# Altium footprint library common.PcbLib: 552 footprints (part 5 of 35) (continued)
## BGA100P26X26-676 [mm] (continued)
  round 0.762 smd paste-0.762 mask+0.711: FID1(-15,15) FID1(15,-15)
  round 1 on Mech7 paste-0.55 mask+1: FID1(-15,15) FID1(15,-15)
Top Layer:
  circle w0.2: c15,-15 r1
  circle w0.2: c-15,15 r1
Top Overlay:
  circle w0.5: c-14.65,12.7 r0.125
  lines w0.254: -13.5,-12.5 -13.5,13.5 12.5,13.5 13.5,12.5 13.5,-12.5 12.5,-13.5 -12.5,-13.5 -13.5,-12.5
Mechanical 7:
  circle w0.25: c-14.65,12.7 r0.125
  circle w0.254: c-15,15 r1
  circle w0.2: c15,-15 r1
  lines w0.1: -13.5,-12.5 -13.5,13.5 12.5,13.5 13.5,12.5 13.5,-12.5 12.5,-13.5 -12.5,-13.5 -13.5,-12.5
  text ".Designator" at -12.9,12.2 h1.2
  text ".Comment" at -12.9,11.2 h1.2
Mechanical 8:
  circle w0.25: c-14.65,12.7 r0.125
  lines w0.025: -13.5,-12 -13.5,-12.5 -12.5,-13.5 -11,-13.5 ; -13.5,-11 -13.5,-10 ; -13.5,-9 -13.5,-8 ; -13.5,-7 -13.5,-6 ; -13.5,-5 -13.5,-4 ; -13.5,-3 -13.5,-2 ; -13.5,-1 -13.5,0 ; -13.5,1 -13.5,2 ; -13.5,3 -13.5,4 ; -13.5,5 -13.5,6 ; -13.5,7 -13.5,8 ; -13.5,9 -13.5,10 ; -13.5,11 -13.5,12 ; -13.5,13 -13.5,13.5 -12,13.5 ; -11,13.5 -10,13.5 ; -10,-13.5 -9,-13.5 ; -9,13.5 -8,13.5 ; -8,-13.5 -7,-13.5 ; -7,13.5 -6,13.5 ; -6,-13.5 -5,-13.5 ; -5,13.5 -4,13.5 ; -4,-13.5 -3,-13.5 ; -3,13.5 -2,13.5 ; -2,-13.5 -1,-13.5 ; -1,13.5 0,13.5 ; 0,-13.5 1,-13.5 ; 1,13.5 2,13.5 ; 2,-13.5 3,-13.5 ; 3,13.5 4,13.5 ; 4,-13.5 5,-13.5 ; 5,13.5 6,13.5 ; 6,-13.5 7,-13.5 ; 7,13.5 8,13.5 ; 8,-13.5 9,-13.5 ; 9,13.5 10,13.5 ; 10,-13.5 11,-13.5 ; 11,13.5 12.5,13.5 13.5,12.5 13.5,12 ; 12,-13.5 12.5,-13.5 13.5,-12.5 13.5,-11 ; 13.5,-10 13.5,-9 ; 13.5,-8 13.5,-7 ; 13.5,-6 13.5,-5 ; 13.5,-4 13.5,-3 ; 13.5,-2 13.5,-1 ; 13.5,0 13.5,1 ; 13.5,2 13.5,3 ; 13.5,4 13.5,5 ; 13.5,6 13.5,7 ; 13.5,8 13.5,9 ; 13.5,10 13.5,11
3D body: height 1.35, standoff 1, extent -13.464,10.015 -9.86,13.502
3D body: height 2.59, standoff 0.41, extent -13.528,-13.503 13.474,13.498

## BGA169 [mm]
pads (169):
  round 0.25 smd: A4(-1.5,1.5) A6(-1.5,2.5) A9(-1.5,4) A11(-1.5,5) AA1(8.5,0) AA2(8.5,0.5) AA3(8.5,1) AA4(8.5,1.5) AA5(8.5,2) AA6(8.5,2.5) AA7(8.5,3) AA8(8.5,3.5) AA9(8.5,4) AA10(8.5,4.5) AA11(8.5,5) AA12(8.5,5.5) AA13(8.5,6) AA14(8.5,6.5) AE1(10.5,0) AE14(10.5,6.5) AG2(11.5,0.5) AG13(11.5,6) AH4(12,1.5) AH6(12,2.5) AH9(12,4) AH11(12,5) B2(-1,0.5) B13(-1,6) D1(0,0) D14(0,6.5) H1(2,0) H2(2,0.5) H3(2,1) H4(2,1.5) H5(2,2) H6(2,2.5) H7(2,3) H8(2,3.5) H9(2,4) H10(2,4.5) H11(2,5) H12(2,5.5) H13(2,6) H14(2,6.5) J1(2.5,0) J2(2.5,0.5) J3(2.5,1) J4(2.5,1.5) J5(2.5,2) J6(2.5,2.5) J7(2.5,3) J8(2.5,3.5) J9(2.5,4) J10(2.5,4.5) J11(2.5,5) J12(2.5,5.5) J13(2.5,6) J14(2.5,6.5) K1(3,0) K2(3,0.5) K3(3,1) K4(3,1.5) K5(3,2) K6(3,2.5) K7(3,3) K8(3,3.5) K9(3,4) K10(3,4.5) K11(3,5) K12(3,5.5) K13(3,6) K14(3,6.5) L1(3.5,0) L2(3.5,0.5) L3(3.5,1) L4(3.5,1.5) L12(3.5,5.5) L13(3.5,6) L14(3.5,6.5) M1(4,0) M2(4,0.5) M3(4,1) M5(4,2) M6(4,2.5) M7(4,3) M8(4,3.5) M9(4,4) M10(4,4.5) M12(4,5.5) M13(4,6) M14(4,6.5) N1(4.5,0) N2(4.5,0.5) N3(4.5,1) N5(4.5,2) N10(4.5,4.5) N12(4.5,5.5) N13(4.5,6) N14(4.5,6.5) P1(5,0) P2(5,0.5) P3(5,1) P5(5,2) P10(5,4.5) P12(5,5.5) P13(5,6) P14(5,6.5) R1(5.5,0) R2(5.5,0.5) R3(5.5,1) R5(5.5,2) R10(5.5,4.5) R12(5.5,5.5) R13(5.5,6) R14(5.5,6.5) T1(6,0) T2(6,0.5) T3(6,1) T5(6,2) T10(6,4.5) T12(6,5.5) T13(6,6) T14(6,6.5) U1(6.5,0) U2(6.5,0.5) U3(6.5,1) U5(6.5,2) U6(6.5,2.5) U7(6.5,3) U8(6.5,3.5) U9(6.5,4) U10(6.5,4.5) U12(6.5,5.5) U13(6.5,6) U14(6.5,6.5) V1(7,0) V2(7,0.5) V3(7,1) V12(7,5.5) V13(7,6) V14(7,6.5) W1(7.5,0) W2(7.5,0.5) W3(7.5,1) W4(7.5,1.5) W5(7.5,2) W6(7.5,2.5) W7(7.5,3) W8(7.5,3.5) W9(7.5,4) W10(7.5,4.5) W11(7.5,5) W12(7.5,5.5) W13(7.5,6) W14(7.5,6.5) Y1(8,0) Y2(8,0.5) Y3(8,1) Y4(8,1.5) Y5(8,2) Y6(8,2.5) Y7(8,3) Y8(8,3.5) Y9(8,4) Y10(8,4.5) Y11(8,5) Y12(8,5.5) Y13(8,6) Y14(8,6.5)
Top Overlay:
  circle w0.25: c-2.6,-3.4 r0.125
  region: -2.75,-1.75 -1.75,-2.75 -2.75,-2.75
  lines w0.2: -2.75,-1.75 -1.75,-2.75 ; -2.75,-2.75 13.25,-2.75 13.25,9.25 -2.75,9.25 -2.75,-2.75
Mechanical 13:
  lines w0.1: -2.75,-2.75 13.25,-2.75 13.25,9.25 -2.75,9.25 -2.75,-2.75
Mechanical 15:
  lines w0.05: -3,-3 13.5,-3 13.5,9.5 -3,9.5 -3,-3
  lines w0.1: 4.75,3.25 5.75,3.25 ; 5.25,2.75 5.25,3.75
3D body: height 0.9, standoff 0.22, extent -2.75,-2.75 13.25,9.25

## BGA176-10X10 [mm] "BGA, 201-Leads, Body 10.00x10.00mmx0.60mm, Pitch 0.65mm"
height 0.6
pads (201):
  round 0.2 smd: A1(-4.55,4.55) A2(-3.9,4.55) A3(-3.25,4.55) A4(-2.6,4.55) A5(-1.95,4.55) A6(-1.3,4.55) A7(-0.65,4.55) A8(0,4.55) A9(0.65,4.55) A10(1.3,4.55) A11(1.95,4.55) A12(2.6,4.55) A13(3.25,4.55) A14(3.9,4.55) A15(4.55,4.55) B1(-4.55,3.9) B2(-3.9,3.9) B3(-3.25,3.9) B4(-2.6,3.9) B5(-1.95,3.9) B6(-1.3,3.9) B7(-0.65,3.9) B8(0,3.9) B9(0.65,3.9) B10(1.3,3.9) B11(1.95,3.9) B12(2.6,3.9) B13(3.25,3.9) B14(3.9,3.9) B15(4.55,3.9) C1(-4.55,3.25) C2(-3.9,3.25) C3(-3.25,3.25) C4(-2.6,3.25) C6(-1.3,3.25) C10(1.3,3.25) C11(1.95,3.25) C12(2.6,3.25) C13(3.25,3.25) C14(3.9,3.25) C15(4.55,3.25) D1(-4.55,2.6) D2(-3.9,2.6) D3(-3.25,2.6) D4(-2.6,2.6) D6(-1.3,2.6) D10(1.3,2.6) D11(1.95,2.6) D12(2.6,2.6) D13(3.25,2.6) D14(3.9,2.6) D15(4.55,2.6) E1(-4.55,1.95) E2(-3.9,1.95) E3(-3.25,1.95) E4(-2.6,1.95) E12(2.6,1.95) E13(3.25,1.95) E14(3.9,1.95) E15(4.55,1.95) F1(-4.55,1.3) F4(-2.6,1.3) F13(3.25,1.3) F14(3.9,1.3) F15(4.55,1.3) G1(-4.55,0.65) G4(-2.6,0.65) G14(3.9,0.65) G15(4.55,0.65) H1(-4.55,0) H2(-3.9,0) H3(-3.25,0) H4(-2.6,0) H14(3.9,0) H15(4.55,0) J1(-4.55,-0.65) J2(-3.9,-0.65) J3(-3.25,-0.65) J4(-2.6,-0.65) J14(3.9,-0.65) J15(4.55,-0.65) K1(-4.55,-1.3) K2(-3.9,-1.3) K3(-3.25,-1.3) K12(2.6,-1.3) K13(3.25,-1.3) K14(3.9,-1.3) K15(4.55,-1.3) L1(-4.55,-1.95) L2(-3.9,-1.95) L3(-3.25,-1.95) L4(-2.6,-1.95) L12(2.6,-1.95) L13(3.25,-1.95) L14(3.9,-1.95) L15(4.55,-1.95) M1(-4.55,-2.6) M2(-3.9,-2.6) M3(-3.25,-2.6) M4(-2.6,-2.6) M5(-1.95,-2.6) M6(-1.3,-2.6) M7(-0.65,-2.6) M10(1.3,-2.6) M11(1.95,-2.6) M12(2.6,-2.6) M13(3.25,-2.6) M14(3.9,-2.6) M15(4.55,-2.6) N1(-4.55,-3.25) N2(-3.9,-3.25) N3(-3.25,-3.25) N4(-2.6,-3.25) N5(-1.95,-3.25) N6(-1.3,-3.25) N7(-0.65,-3.25) N11(1.95,-3.25) N12(2.6,-3.25) N13(3.25,-3.25) N14(3.9,-3.25) N15(4.55,-3.25) P1(-4.55,-3.9) P2(-3.9,-3.9) P3(-3.25,-3.9) P4(-2.6,-3.9) P5(-1.95,-3.9) P6(-1.3,-3.9) P7(-0.65,-3.9) P8(0,-3.9) P9(0.65,-3.9) P10(1.3,-3.9) P11(1.95,-3.9) P12(2.6,-3.9) P13(3.25,-3.9) P14(3.9,-3.9) P15(4.55,-3.9) P$_VDD(-3.25,0.65) P$_VDD(-3.25,1.3) P$_VDD(-2.6,-1.3) P$_VDD(-1.95,3.25) P$_VDD(-0.65,3.25) P$_VDD(0,-3.25) P$_VDD(0,3.25) P$_VDD(0.65,-3.25) P$_VDD(0.65,3.25) P$_VDD(1.3,-3.25) P$_VDD(2.6,-0.65) P$_VDD(3.25,-0.65) P$_VDD(3.25,0) P$_VDD(3.25,0.65) P$_VSS(-3.9,0.65) P$_VSS(-3.9,1.3) P$_VSS(-1.95,2.6) P$_VSS(-1.3,-1.3) P$_VSS(-1.3,-0.65) P$_VSS(-1.3,0) P$_VSS(-1.3,0.65) P$_VSS(-1.3,1.3) P$_VSS(-0.65,-1.3) P$_VSS(-0.65,-0.65) P$_VSS(-0.65,0) P$_VSS(-0.65,0.65) P$_VSS(-0.65,1.3) P$_VSS(-0.65,2.6) P$_VSS(0,-2.6) P$_VSS(0,-1.3) P$_VSS(0,-0.65) P$_VSS(0,0) P$_VSS(0,0.65) P$_VSS(0,1.3) P$_VSS(0,2.6) P$_VSS(0.65,-2.6) P$_VSS(0.65,-1.3) P$_VSS(0.65,-0.65) P$_VSS(0.65,0) P$_VSS(0.65,0.65) P$_VSS(0.65,1.3) P$_VSS(0.65,2.6) P$_VSS(1.3,-1.3) P$_VSS(1.3,-0.65) P$_VSS(1.3,0) P$_VSS(1.3,0.65) P$_VSS(1.3,1.3) P$_VSS(2.6,0) P$_VSS(2.6,0.65) P$_VSS(2.6,1.3) R1(-4.55,-4.55) R2(-3.9,-4.55) R3(-3.25,-4.55) R4(-2.6,-4.55) R5(-1.95,-4.55) R6(-1.3,-4.55) R7(-0.65,-4.55) R8(0,-4.55) R9(0.65,-4.55) R10(1.3,-4.55) R11(1.95,-4.55) R12(2.6,-4.55) R13(3.25,-4.55) R14(3.9,-4.55) R15(4.55,-4.55)
Top Overlay:
  circle w0.25: c-5.21,5.21 r0.125
  lines w0.1: -5,-5 5,-5 5,5 -5,5 -5,-5
3D body: height 0, standoff -1, extent -5,-5 5,5

## BGA176-15X15 [mm] "BGA, 176-Leads, Body 15.00x15.00mmx3.50mm, Pitch 1.00mm"
height 3.5
pads (176):
  round 0.5 smd: A1(-6.5,6.5) A2(-5.5,6.5) A3(-4.5,6.5) A4(-3.5,6.5) A5(-2.5,6.5) A6(-1.5,6.5) A7(-0.5,6.5) A8(0.5,6.5) A9(1.5,6.5) A10(2.5,6.5) A11(3.5,6.5) A12(4.5,6.5) A13(5.5,6.5) A14(6.5,6.5) B1(-6.5,5.5) B2(-5.5,5.5) B3(-4.5,5.5) B4(-3.5,5.5) B5(-2.5,5.5) B6(-1.5,5.5) B7(-0.5,5.5) B8(0.5,5.5) B9(1.5,5.5) B10(2.5,5.5) B11(3.5,5.5) B12(4.5,5.5) B13(5.5,5.5) B14(6.5,5.5) C1(-6.5,4.5) C2(-5.5,4.5) C3(-4.5,4.5) C4(-3.5,4.5) C5(-2.5,4.5) C6(-1.5,4.5) C7(-0.5,4.5) C8(0.5,4.5) C9(1.5,4.5) C10(2.5,4.5) C11(3.5,4.5) C12(4.5,4.5) C13(5.5,4.5) C14(6.5,4.5) D1(-6.5,3.5) D2(-5.5,3.5) D3(-4.5,3.5) D4(-3.5,3.5) D5(-2.5,3.5) D6(-1.5,3.5) D7(-0.5,3.5) D8(0.5,3.5) D9(1.5,3.5) D10(2.5,3.5) D11(3.5,3.5) D12(4.5,3.5) D13(5.5,3.5) D14(6.5,3.5) E1(-6.5,2.5) E2(-5.5,2.5) E3(-4.5,2.5) E4(-3.5,2.5) E11(3.5,2.5) E12(4.5,2.5) E13(5.5,2.5) E14(6.5,2.5) F1(-6.5,1.5) F2(-5.5,1.5) F3(-4.5,1.5) F4(-3.5,1.5) F6(-1.5,1.5) F7(-0.5,1.5) F8(0.5,1.5) F9(1.5,1.5) F11(3.5,1.5) F12(4.5,1.5) F13(5.5,1.5) F14(6.5,1.5) G1(-6.5,0.5) G2(-5.5,0.5) G3(-4.5,0.5) G4(-3.5,0.5) G6(-1.5,0.5) G7(-0.5,0.5) G8(0.5,0.5) G9(1.5,0.5) G11(3.5,0.5) G12(4.5,0.5) G13(5.5,0.5) G14(6.5,0.5) H1(-6.5,-0.5) H2(-5.5,-0.5) H3(-4.5,-0.5) H4(-3.5,-0.5) H6(-1.5,-0.5) H7(-0.5,-0.5) H8(0.5,-0.5) H9(1.5,-0.5) H11(3.5,-0.5) H12(4.5,-0.5) H13(5.5,-0.5) H14(6.5,-0.5) J1(-6.5,-1.5) J2(-5.5,-1.5) J3(-4.5,-1.5) J4(-3.5,-1.5) J6(-1.5,-1.5) J7(-0.5,-1.5) J8(0.5,-1.5) J9(1.5,-1.5) J11(3.5,-1.5) J12(4.5,-1.5) J13(5.5,-1.5) J14(6.5,-1.5) K1(-6.5,-2.5) K2(-5.5,-2.5) K3(-4.5,-2.5) K4(-3.5,-2.5) K11(3.5,-2.5) K12(4.5,-2.5) K13(5.5,-2.5) K14(6.5,-2.5) L1(-6.5,-3.5) L2(-5.5,-3.5) L3(-4.5,-3.5) L4(-3.5,-3.5) L5(-2.5,-3.5) L6(-1.5,-3.5) L7(-0.5,-3.5) L8(0.5,-3.5) L9(1.5,-3.5) L10(2.5,-3.5) L11(3.5,-3.5) L12(4.5,-3.5) L13(5.5,-3.5) L14(6.5,-3.5) M1(-6.5,-4.5) M2(-5.5,-4.5) M3(-4.5,-4.5) M4(-3.5,-4.5) M5(-2.5,-4.5) M6(-1.5,-4.5) M7(-0.5,-4.5) M8(0.5,-4.5) M9(1.5,-4.5) M10(2.5,-4.5) M11(3.5,-4.5) M12(4.5,-4.5) M13(5.5,-4.5) M14(6.5,-4.5) N1(-6.5,-5.5) N2(-5.5,-5.5) N3(-4.5,-5.5) N4(-3.5,-5.5) N5(-2.5,-5.5) N6(-1.5,-5.5) N7(-0.5,-5.5) N8(0.5,-5.5) N9(1.5,-5.5) N10(2.5,-5.5) N11(3.5,-5.5) N12(4.5,-5.5) N13(5.5,-5.5) N14(6.5,-5.5) P1(-6.5,-6.5) P2(-5.5,-6.5) P3(-4.5,-6.5) P4(-3.5,-6.5) P5(-2.5,-6.5) P6(-1.5,-6.5) P7(-0.5,-6.5) P8(0.5,-6.5) P9(1.5,-6.5) P10(2.5,-6.5) P11(3.5,-6.5) P12(4.5,-6.5) P13(5.5,-6.5) P14(6.5,-6.5)
Top Overlay:
  circle w0.25: c-8.15,7.35 r0.125
  region: -6.5,7.5 -7.5,6.5 -7.5,7.5
  lines w0.2: -7.5,6.5 -6.5,7.5 ; -7.5,-7.5 -7.5,7.5 7.5,7.5 7.5,-7.5 -7.5,-7.5
Mechanical 13:
  lines w0.1: -7.5,-7.5 -7.5,7.5 7.5,7.5 7.5,-7.5 -7.5,-7.5
3D body: height 3.5, standoff 0.3, extent -7.5,-7.5 7.5,7.5

## BGA256 [mil]
pads (256):
  round 20 smd: A1(0,0) A2(39.37,0) A3(78.74,0) A4(118.11,0) A5(157.48,0) A6(196.85,0) A7(236.22,0) A8(275.59,0) A9(314.96,0) A10(354.33,0) A11(393.7,0) A12(433.07,0) A13(472.44,0) A14(511.81,0) A15(551.18,0) A16(590.55,0) B1(0,-39.37) B2(39.37,-39.37) B3(78.74,-39.37) B4(118.11,-39.37) B5(157.48,-39.37) B6(196.85,-39.37) B7(236.22,-39.37) B8(275.59,-39.37) B9(314.96,-39.37) B10(354.33,-39.37) B11(393.7,-39.37) B12(433.07,-39.37) B13(472.44,-39.37) B14(511.81,-39.37) B15(551.18,-39.37) B16(590.55,-39.37) C1(0,-78.74) C2(39.37,-78.74) C3(78.74,-78.74) C4(118.11,-78.74) C5(157.48,-78.74) C6(196.85,-78.74) C7(236.22,-78.74) C8(275.59,-78.74) C9(314.96,-78.74) C10(354.33,-78.74) C11(393.7,-78.74) C12(433.07,-78.74) C13(472.44,-78.74) C14(511.81,-78.74) C15(551.18,-78.74) C16(590.55,-78.74) D1(0,-118.11) D2(39.37,-118.11) D3(78.74,-118.11) D4(118.11,-118.11) D5(157.48,-118.11) D6(196.85,-118.11) D7(236.22,-118.11) D8(275.59,-118.11) D9(314.96,-118.11) D10(354.33,-118.11) D11(393.7,-118.11) D12(433.07,-118.11) D13(472.44,-118.11) D14(511.81,-118.11) D15(551.18,-118.11) D16(590.55,-118.11) E1(0,-157.48) E2(39.37,-157.48) E3(78.74,-157.48) E4(118.11,-157.48) E5(157.48,-157.48) E6(196.85,-157.48) E7(236.22,-157.48) E8(275.59,-157.48) E9(314.96,-157.48) E10(354.33,-157.48) E11(393.7,-157.48) E12(433.07,-157.48) E13(472.44,-157.48) E14(511.81,-157.48) E15(551.18,-157.48) E16(590.55,-157.48) F1(0,-196.85) F2(39.37,-196.85) F3(78.74,-196.85) F4(118.11,-196.85) F5(157.48,-196.85) F6(196.85,-196.85) F7(236.22,-196.85) F8(275.59,-196.85) F9(314.96,-196.85) F10(354.33,-196.85) F11(393.7,-196.85) F12(433.07,-196.85) F13(472.44,-196.85) F14(511.81,-196.85) F15(551.18,-196.85) F16(590.55,-196.85) G1(0,-236.22) G2(39.37,-236.22) G3(78.74,-236.22) G4(118.11,-236.22) G5(157.48,-236.22) G6(196.85,-236.22) G7(236.22,-236.22) G8(275.59,-236.22) G9(314.96,-236.22) G10(354.33,-236.22) G11(393.7,-236.22) G12(433.07,-236.22) G13(472.44,-236.22) G14(511.81,-236.22) G15(551.18,-236.22) G16(590.55,-236.22) H1(0,-275.59) H2(39.37,-275.59) H3(78.74,-275.59) H4(118.11,-275.59) H5(157.48,-275.59) H6(196.85,-275.59) H7(236.22,-275.59) H8(275.59,-275.59) H9(314.96,-275.59) H10(354.33,-275.59) H11(393.7,-275.59) H12(433.07,-275.59) H13(472.44,-275.59) H14(511.81,-275.59) H15(551.18,-275.59) H16(590.55,-275.59) J1(0,-313.99) J2(39.37,-313.99) J3(78.74,-313.99) J4(118.11,-313.99) J5(157.48,-313.99) J6(196.85,-313.99) J7(236.22,-313.99) J8(275.59,-313.99) J9(314.96,-313.99) J10(354.33,-313.99) J11(393.7,-313.99) J12(433.07,-313.99) J13(472.44,-313.99) J14(511.81,-313.99) J15(551.18,-313.99) J16(590.55,-313.99) K1(0,-354) K2(39.37,-354) K3(78.74,-354) K4(118.11,-354) K5(157.48,-354) K6(196.85,-354) K7(236.22,-354) K8(275.59,-354) K9(314.96,-354) K10(354.33,-354) K11(393.7,-354) K12(433.07,-354) K13(472.44,-354) K14(511.81,-354) K15(551.18,-354) K16(590.55,-354) L1(0,-393.7) L2(39.37,-393.7) L3(78.74,-393.7) L4(118.11,-393.7) L5(157.48,-393.7) L6(196.85,-393.7) L7(236.22,-393.7) L8(275.59,-393.7) L9(314.96,-393.7) L10(354.33,-393.7) L11(393.7,-393.7) L12(433.07,-393.7) L13(472.44,-393.7) L14(511.81,-393.7) L15(551.18,-393.7) L16(590.55,-393.7) M1(0,-433.07) M2(39.37,-433.07) M3(78.74,-433.07) M4(118.11,-433.07) M5(157.48,-433.07) M6(196.85,-433.07) M7(236.22,-433.07) M8(275.59,-433.07) M9(314.96,-433.07) M10(354.33,-433.07) M11(393.7,-433.07) M12(433.07,-433.07) M13(472.44,-433.07) M14(511.81,-433.07) M15(551.18,-433.07) M16(590.55,-433.07) N1(0,-471.97) N2(39.37,-471.97) N3(78.74,-471.97) N4(118.11,-471.97) N5(157.48,-471.97) N6(196.85,-471.97) N7(236.22,-471.97) N8(275.59,-471.97) N9(314.96,-471.97) N10(354.33,-471.97) N11(393.7,-471.97) N12(433.07,-471.97) N13(472.44,-471.97) N14(511.81,-471.97) N15(551.18,-471.97) N16(590.55,-471.97) P1(0,-510.94) P2(39.37,-510.94) P3(78.74,-510.94) P4(118.11,-510.94) P5(157.48,-510.94) P6(196.85,-510.94) P7(236.22,-510.94) P8(275.59,-510.94) P9(314.96,-510.94) P10(354.33,-510.94) P11(393.7,-510.94) P12(433.07,-510.94) P13(472.44,-510.94) P14(511.81,-510.94) P15(551.18,-510.94) P16(590.55,-510.94) R1(0,-550.96) R2(39.37,-550.96) R3(78.74,-550.96) R4(118.11,-550.96) R5(157.48,-550.96) R6(196.85,-550.96) R7(236.22,-550.96) R8(275.59,-550.96) R9(314.96,-550.96) R10(354.33,-550.96) R11(393.7,-550.96) R12(433.07,-550.96) R13(472.44,-550.96) R14(511.81,-550.96) R15(551.18,-550.96) R16(590.55,-550.96) T1(0,-590.55) T2(39.37,-590.55) T3(78.74,-590.55) T4(118.11,-590.55) T5(157.48,-590.55) T6(196.85,-590.55) T7(236.22,-590.55) T8(275.59,-590.55) T9(314.96,-590.55) T10(354.33,-590.55) T11(393.7,-590.55) T12(433.07,-590.55) T13(472.44,-590.55) T14(511.81,-590.55) T15(551.18,-590.55) T16(590.55,-590.55)
Top Overlay:
  lines w8: -42.98,20.07 -15.98,47.07 635.23,47.07 635.23,-630.93 -42.77,-630.93 -42.77,18.09
Mechanical 13:
  text "16" at 585,-658 h20
  text "15" at 544.67,-658 h20
  text "15" at 544.67,-658 h20
  text "14" at 504.33,-658 h20
  text "13" at 464,-658 h20
  text "12" at 423.67,-658 h20
  text "11" at 388,-658 h20
  text "10" at 343,-658 h20
  text "10" at 343,-658 h20
  text "9" at 311,-658 h20
  text "8" at 272,-658 h20
  text "7" at 234,-658 h20
  text "6" at 191,-658 h20
  text "5" at 152,-658 h20
  text "4" at 110,-658 h20
  text "3" at 73,-658 h20
  text "2" at 32,-658 h20
  text "1" at -3,-658 h20
  text "1" at -3,-658 h20
  text "T" at -67,-606 h25
  text "R" at -67,-566.33 h25
  text "P" at -67,-526.67 h25
  text "N" at -67,-487 h25
  text "M" at -67,-447.33 h25
  text "L" at -67,-407.67 h25
  text "K" at -67,-368 h25
  text "J" at -67,-328.33 h25
  text "H" at -67,-288.67 h25
  text "G" at -67,-249 h25
  text "F" at -67,-209.33 h25
  text "E" at -67,-169.67 h25
  text "D" at -67,-130 h25
  text "C" at -67,-90.33 h25
  text "B" at -67,-50.67 h25
  text "A" at -67,-11 h25
3D body: height 39.37, standoff 0, extent -42.98,-630.93 635.23,49.07

## BGA324 [mm] "18X18-0.5PICH"
height 2.54
pads (324):
  round 0.3 smd: A1(0,0) A2(0.5,0) A3(1,0) A4(1.5,0) A5(2,0) A6(2.5,0) A7(3,0) A8(3.5,0) A9(4,0) A10(4.5,0) A11(5,0) A12(5.5,0) A13(6,0) A14(6.5,0) A15(7,0) A16(7.5,0) A17(8,0) A18(8.5,0) B1(0,-0.5) B2(0.5,-0.5) B3(1,-0.5) B4(1.5,-0.5) B5(2,-0.5) B6(2.5,-0.5) B7(3,-0.5) B8(3.5,-0.5) B9(4,-0.5) B10(4.5,-0.5) B11(5,-0.5) B12(5.5,-0.5) B13(6,-0.5) B14(6.5,-0.5) B15(7,-0.5) B16(7.5,-0.5) B17(8,-0.5) B18(8.5,-0.5) C1(0,-1) C2(0.5,-1) C3(1,-1) C4(1.5,-1) C5(2,-1) C6(2.5,-1) C7(3,-1) C8(3.5,-1) C9(4,-1) C10(4.5,-1) C11(5,-1) C12(5.5,-1) C13(6,-1) C14(6.5,-1) C15(7,-1) C16(7.5,-1) C17(8,-1) C18(8.5,-1) D1(0,-1.5) D2(0.5,-1.5) D3(1,-1.5) D4(1.5,-1.5) D5(2,-1.5) D6(2.5,-1.5) D7(3,-1.5) D8(3.5,-1.5) D9(4,-1.5) D10(4.5,-1.5) D11(5,-1.5) D12(5.5,-1.5) D13(6,-1.5) D14(6.5,-1.5) D15(7,-1.5) D16(7.5,-1.5) D17(8,-1.5) D18(8.5,-1.5) E1(0,-2) E2(0.5,-2) E3(1,-2) E4(1.5,-2) E5(2,-2) E6(2.5,-2) E7(3,-2) E8(3.5,-2) E9(4,-2) E10(4.5,-2) E11(5,-2) E12(5.5,-2) E13(6,-2) E14(6.5,-2) E15(7,-2) E16(7.5,-2) E17(8,-2) E18(8.5,-2) F1(0,-2.5) F2(0.5,-2.5) F3(1,-2.5) F4(1.5,-2.5) F5(2,-2.5) F6(2.5,-2.5) F7(3,-2.5) F8(3.5,-2.5) F9(4,-2.5) F10(4.5,-2.5) F11(5,-2.5) F12(5.5,-2.5) F13(6,-2.5) F14(6.5,-2.5) F15(7,-2.5) F16(7.5,-2.5) F17(8,-2.5) F18(8.5,-2.5) G1(0,-3) G2(0.5,-3) G3(1,-3) G4(1.5,-3) G5(2,-3) G6(2.5,-3) G7(3,-3) G8(3.5,-3) G9(4,-3) G10(4.5,-3) G11(5,-3) G12(5.5,-3) G13(6,-3) G14(6.5,-3) G15(7,-3) G16(7.5,-3) G17(8,-3) G18(8.5,-3) H1(0,-3.5) H2(0.5,-3.5) H3(1,-3.5) H4(1.5,-3.5) H5(2,-3.5) H6(2.5,-3.5) H7(3,-3.5) H8(3.5,-3.5) H9(4,-3.5) H10(4.5,-3.5) H11(5,-3.5) H12(5.5,-3.5) H13(6,-3.5) H14(6.5,-3.5) H15(7,-3.5) H16(7.5,-3.5) H17(8,-3.5) H18(8.5,-3.5) J1(0,-4) J2(0.5,-4) J3(1,-4) J4(1.5,-4) J5(2,-4) J6(2.5,-4) J7(3,-4) J8(3.5,-4) J9(4,-4) J10(4.5,-4) J11(5,-4) J12(5.5,-4) J13(6,-4) J14(6.5,-4) J15(7,-4) J16(7.5,-4) J17(8,-4) J18(8.5,-4) K1(0,-4.5) K2(0.5,-4.5) K3(1,-4.5) K4(1.5,-4.5) K5(2,-4.5) K6(2.5,-4.5) K7(3,-4.5) K8(3.5,-4.5) K9(4,-4.5) K10(4.5,-4.5) K11(5,-4.5) K12(5.5,-4.5) K13(6,-4.5) K14(6.5,-4.5) K15(7,-4.5) K16(7.5,-4.5) K17(8,-4.5) K18(8.5,-4.5) L1(0,-5) L2(0.5,-5) L3(1,-5) L4(1.5,-5) L5(2,-5) L6(2.5,-5) L7(3,-5) L8(3.5,-5) L9(4,-5) L10(4.5,-5) L11(5,-5) L12(5.5,-5) L13(6,-5) L14(6.5,-5) L15(7,-5) L16(7.5,-5) L17(8,-5) L18(8.5,-5) M1(0,-5.5) M2(0.5,-5.5) M3(1,-5.5) M4(1.5,-5.5) M5(2,-5.5) M6(2.5,-5.5) M7(3,-5.5) M8(3.5,-5.5) M9(4,-5.5) M10(4.5,-5.5) M11(5,-5.5) M12(5.5,-5.5) M13(6,-5.5) M14(6.5,-5.5) M15(7,-5.5) M16(7.5,-5.5) M17(8,-5.5) M18(8.5,-5.5) N1(0,-6) N2(0.5,-6) N3(1,-6) N4(1.5,-6) N5(2,-6) N6(2.5,-6) N7(3,-6) N8(3.5,-6) N9(4,-6) N10(4.5,-6) N11(5,-6) N12(5.5,-6) N13(6,-6) N14(6.5,-6) N15(7,-6) N16(7.5,-6) N17(8,-6) N18(8.5,-6) P1(0,-6.5) P2(0.5,-6.5) P3(1,-6.5) P4(1.5,-6.5) P5(2,-6.5) P6(2.5,-6.5) P7(3,-6.5) P8(3.5,-6.5) P9(4,-6.5) P10(4.5,-6.5) P11(5,-6.5) P12(5.5,-6.5) P13(6,-6.5) P14(6.5,-6.5) P15(7,-6.5) P16(7.5,-6.5) P17(8,-6.5) P18(8.5,-6.5) R1(0,-7) R2(0.5,-7) R3(1,-7) R4(1.5,-7) R5(2,-7) R6(2.5,-7) R7(3,-7) R8(3.5,-7) R9(4,-7) R10(4.5,-7) R11(5,-7) R12(5.5,-7) R13(6,-7) R14(6.5,-7) R15(7,-7) R16(7.5,-7) R17(8,-7) R18(8.5,-7) T1(0,-7.5) T2(0.5,-7.5) T3(1,-7.5) T4(1.5,-7.5) T5(2,-7.5) T6(2.5,-7.5) T7(3,-7.5) T8(3.5,-7.5) T9(4,-7.5) T10(4.5,-7.5) T11(5,-7.5) T12(5.5,-7.5) T13(6,-7.5) T14(6.5,-7.5) T15(7,-7.5) T16(7.5,-7.5) T17(8,-7.5) T18(8.5,-7.5) U1(0,-8) U2(0.5,-8) U3(1,-8) U4(1.5,-8) U5(2,-8) U6(2.5,-8) U7(3,-8) U8(3.5,-8) U9(4,-8) U10(4.5,-8) U11(5,-8) U12(5.5,-8) U13(6,-8) U14(6.5,-8) U15(7,-8) U16(7.5,-8) U17(8,-8) U18(8.5,-8) V1(0,-8.5) V2(0.5,-8.5) V3(1,-8.5) V4(1.5,-8.5) V5(2,-8.5) V6(2.5,-8.5) V7(3,-8.5) V8(3.5,-8.5) V9(4,-8.5) V10(4.5,-8.5) V11(5,-8.5) V12(5.5,-8.5) V13(6,-8.5) V14(6.5,-8.5) V15(7,-8.5) V16(7.5,-8.5) V17(8,-8.5) V18(8.5,-8.5)
Top Overlay:
  circle w0.25: c-1.4,0.6 r0.125
  region: 0.25,0.75 -0.75,-0.25 -0.75,0.75
  lines w0.2: -0.75,-0.25 0.25,0.75 ; -0.75,-9.25 9.25,-9.25 9.25,0.75 -0.75,0.75 -0.75,-9.25
Mechanical 15:
  lines w0.1: 3.746,-4.246 4.746,-4.246 ; 4.246,-4.746 4.246,-3.746
3D body: height 1, standoff 0.1, extent -0.75,-9.25 9.25,0.75